# Altium footprint library con-molex.PCBLIB: 368 footprints (part 10 of 26)
Each footprint in its own frame and in the unit in brackets; x right, y up, seen from the top. Pads: shape width x height; smd on the part's side, far side on the other; paste and mask are expansions set on the pad; w line width, h text height; cw(c..) or ccw(c..) is an arc to the next point about the centre after c.
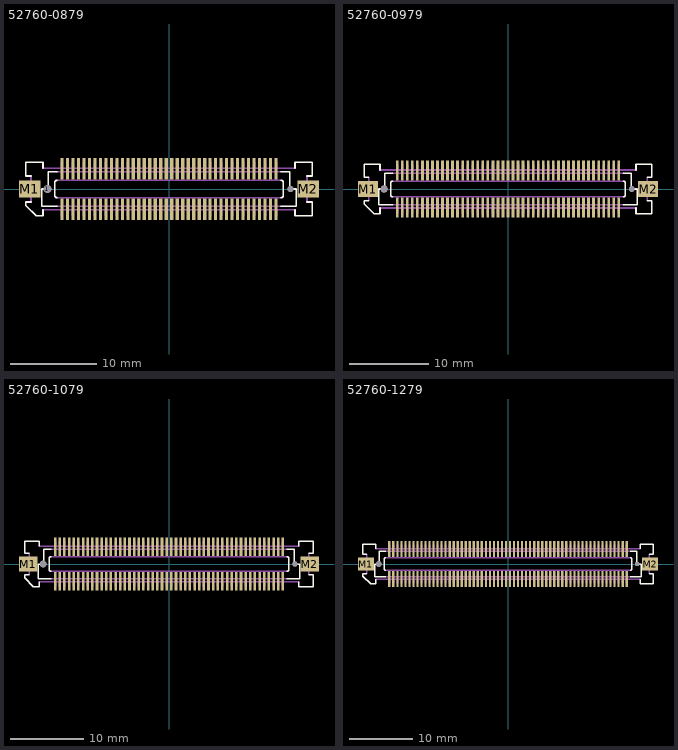
[diagram p9: the footprints below, top view; thin cyan lines are the x and y axes]

## 52760-0879 [mm]
pads (84):
  round 0.9 hole 0.9: 1(-14.035,0)
  rect 0.35x2.5 smd: 1(-12.383,-2.35) 2(-12.383,2.35) 3(-11.747,-2.35) 4(-11.747,2.35) 5(-11.112,-2.35) 6(-11.112,2.35) 7(-10.477,-2.35) 8(-10.477,2.35) 9(-9.842,-2.35) 10(-9.842,2.35) 11(-9.207,-2.35) 12(-9.207,2.35) 13(-8.572,-2.35) 14(-8.572,2.35) 15(-7.938,-2.35) 16(-7.938,2.35) 17(-7.302,-2.35) 18(-7.302,2.35) 19(-6.667,-2.35) 20(-6.667,2.35) 21(-6.032,-2.35) 22(-6.032,2.35) 23(-5.397,-2.35) 24(-5.397,2.35) 25(-4.763,-2.35) 26(-4.763,2.35) 27(-4.127,-2.35) 28(-4.127,2.35) 29(-3.492,-2.35) 30(-3.492,2.35) 31(-2.857,-2.35) 32(-2.857,2.35) 33(-2.222,-2.35) 34(-2.222,2.35) 35(-1.587,-2.35) 36(-1.587,2.35) 37(-0.953,-2.35) 38(-0.953,2.35) 39(-0.318,-2.35) 40(-0.318,2.35) 41(0.318,-2.35) 42(0.318,2.35) 43(0.953,-2.35) 44(0.953,2.35) 45(1.587,-2.35) 46(1.587,2.35) 47(2.222,-2.35) 48(2.222,2.35) 49(2.857,-2.35) 50(2.857,2.35) 51(3.492,-2.35) 52(3.492,2.35) 53(4.127,-2.35) 54(4.127,2.35) 55(4.763,-2.35) 56(4.763,2.35) 57(5.397,-2.35) 58(5.397,2.35) 59(6.032,-2.35) 60(6.032,2.35) 61(6.667,-2.35) 62(6.667,2.35) 63(7.302,-2.35) 64(7.302,2.35) 65(7.938,-2.35) 66(7.938,2.35) 67(8.572,-2.35) 68(8.572,2.35) 69(9.207,-2.35) 70(9.207,2.35) 71(9.842,-2.35) 72(9.842,2.35) 73(10.477,-2.35) 74(10.477,2.35) 75(11.112,-2.35) 76(11.112,2.35) 77(11.747,-2.35) 78(11.747,2.35) 79(12.383,-2.35) 80(12.383,2.35)
  round 0.7 hole 0.7: 1(14.035,0)
  rect 2.5x2 smd: M1(-16.075,0) M2(16.075,0)
Top Overlay:
  lines w0.203: -15.95,-1.5 -16.55,-1.5 -16.55,-1.9 -15.35,-3.1 -14.55,-3.1 -14.55,-2.4 ; -15.95,1.5 -16.55,1.5 -16.55,3.1 -14.55,3.1 -14.55,2.4 ; -12.95,-2 -14.7,-2 -14.7,0 -13.95,0 -13.95,2 -12.95,2 ; -12.95,-1 cw(c-12.95,-0.75) -13.2,-0.75 -13.2,0.75 cw(c-12.95,0.75) -12.95,1 ; 12.95,-2 14.7,-2 14.7,0 13.95,0 13.95,2 12.95,2 ; 12.95,-1 ccw(c12.95,-0.75) 13.2,-0.75 13.2,0.75 ccw(c12.95,0.75) 12.95,1 ; 14.55,-2.4 14.55,-3.1 16.55,-3.1 16.55,-1.5 15.95,-1.5 ; 14.55,2.4 14.55,3.1 16.55,3.1 16.55,1.5 15.95,1.5
Top Solder:
  rectangle: -12.582,-3.625 -12.183,-1.075
  region: -12.183,3.625 -12.582,3.625 -12.582,1.075 -12.183,1.075
  rectangle: -11.947,-3.625 -11.548,-1.075
  region: -11.548,3.625 -11.947,3.625 -11.947,1.075 -11.548,1.075
  rectangle: -11.312,-3.625 -10.913,-1.075
  region: -10.913,3.625 -11.312,3.625 -11.312,1.075 -10.913,1.075
  rectangle: -10.677,-3.625 -10.278,-1.075
  region: -10.278,3.625 -10.677,3.625 -10.677,1.075 -10.278,1.075
  rectangle: -10.042,-3.625 -9.643,-1.075
  region: -9.643,3.625 -10.042,3.625 -10.042,1.075 -9.643,1.075
  rectangle: -9.407,-3.625 -9.008,-1.075
  region: -9.008,3.625 -9.407,3.625 -9.407,1.075 -9.008,1.075
  rectangle: -8.772,-3.625 -8.373,-1.075
  region: -8.373,3.625 -8.772,3.625 -8.772,1.075 -8.373,1.075
  rectangle: -8.137,-3.625 -7.738,-1.075
  region: -7.738,3.625 -8.137,3.625 -8.137,1.075 -7.738,1.075
  rectangle: -7.502,-3.625 -7.103,-1.075
  region: -7.103,3.625 -7.502,3.625 -7.502,1.075 -7.103,1.075
  rectangle: -6.867,-3.625 -6.468,-1.075
  region: -6.468,3.625 -6.867,3.625 -6.867,1.075 -6.468,1.075
  rectangle: -6.232,-3.625 -5.833,-1.075
  region: -5.833,3.625 -6.232,3.625 -6.232,1.075 -5.833,1.075
  rectangle: -5.597,-3.625 -5.198,-1.075
  region: -5.198,3.625 -5.597,3.625 -5.597,1.075 -5.198,1.075
  rectangle: -4.962,-3.625 -4.563,-1.075
  region: -4.563,3.625 -4.962,3.625 -4.962,1.075 -4.563,1.075
  rectangle: -4.327,-3.625 -3.928,-1.075
  region: -3.928,3.625 -4.327,3.625 -4.327,1.075 -3.928,1.075
  rectangle: -3.692,-3.625 -3.293,-1.075
  region: -3.293,3.625 -3.692,3.625 -3.692,1.075 -3.293,1.075
  rectangle: -3.057,-3.625 -2.658,-1.075
  region: -2.658,3.625 -3.057,3.625 -3.057,1.075 -2.658,1.075
  rectangle: -2.422,-3.625 -2.023,-1.075
  region: -2.023,3.625 -2.422,3.625 -2.422,1.075 -2.023,1.075
  rectangle: -1.787,-3.625 -1.388,-1.075
  region: -1.388,3.625 -1.787,3.625 -1.787,1.075 -1.388,1.075
  rectangle: -1.152,-3.625 -0.753,-1.075
  region: -0.753,3.625 -1.152,3.625 -1.152,1.075 -0.753,1.075
  rectangle: -0.517,-3.625 -0.118,-1.075
  region: -0.118,3.625 -0.517,3.625 -0.517,1.075 -0.118,1.075
  rectangle: 0.118,-3.625 0.517,-1.075
  region: 0.517,3.625 0.118,3.625 0.118,1.075 0.517,1.075
  rectangle: 0.753,-3.625 1.152,-1.075
  region: 1.152,3.625 0.753,3.625 0.753,1.075 1.152,1.075
  rectangle: 1.388,-3.625 1.787,-1.075
  region: 1.787,3.625 1.388,3.625 1.388,1.075 1.787,1.075
  rectangle: 2.023,-3.625 2.422,-1.075
  region: 2.422,3.625 2.023,3.625 2.023,1.075 2.422,1.075
  rectangle: 2.658,-3.625 3.057,-1.075
  region: 3.057,3.625 2.658,3.625 2.658,1.075 3.057,1.075
  rectangle: 3.293,-3.625 3.692,-1.075
  region: 3.692,3.625 3.293,3.625 3.293,1.075 3.692,1.075
  rectangle: 3.928,-3.625 4.327,-1.075
  region: 4.327,3.625 3.928,3.625 3.928,1.075 4.327,1.075
  rectangle: 4.563,-3.625 4.962,-1.075
  region: 4.962,3.625 4.563,3.625 4.563,1.075 4.962,1.075
  rectangle: 5.198,-3.625 5.597,-1.075
  region: 5.597,3.625 5.198,3.625 5.198,1.075 5.597,1.075
  rectangle: 5.833,-3.625 6.232,-1.075
  region: 6.232,3.625 5.833,3.625 5.833,1.075 6.232,1.075
  rectangle: 6.468,-3.625 6.867,-1.075
  region: 6.867,3.625 6.468,3.625 6.468,1.075 6.867,1.075
  rectangle: 7.103,-3.625 7.502,-1.075
  region: 7.502,3.625 7.103,3.625 7.103,1.075 7.502,1.075
  rectangle: 7.738,-3.625 8.137,-1.075
  region: 8.137,3.625 7.738,3.625 7.738,1.075 8.137,1.075
  rectangle: 8.373,-3.625 8.772,-1.075
  region: 8.772,3.625 8.373,3.625 8.373,1.075 8.772,1.075
  rectangle: 9.008,-3.625 9.407,-1.075
  region: 9.407,3.625 9.008,3.625 9.008,1.075 9.407,1.075
  rectangle: 9.643,-3.625 10.042,-1.075
  region: 10.042,3.625 9.643,3.625 9.643,1.075 10.042,1.075
  rectangle: 10.278,-3.625 10.677,-1.075
  region: 10.677,3.625 10.278,3.625 10.278,1.075 10.677,1.075
  rectangle: 10.913,-3.625 11.312,-1.075
  region: 11.312,3.625 10.913,3.625 10.913,1.075 11.312,1.075
  rectangle: 11.548,-3.625 11.947,-1.075
  region: 11.947,3.625 11.548,3.625 11.548,1.075 11.947,1.075
  rectangle: 12.183,-3.625 12.582,-1.075
  region: 12.582,3.625 12.183,3.625 12.183,1.075 12.582,1.075
Mechanical 16:
  rectangle: -12.533,-3.1 -12.232,-2.375
  region: -12.232,3.1 -12.533,3.1 -12.533,2.375 -12.232,2.375
  rectangle: -11.898,-3.1 -11.597,-2.375
  region: -11.597,3.1 -11.898,3.1 -11.898,2.375 -11.597,2.375
  rectangle: -11.263,-3.1 -10.962,-2.375
  region: -10.962,3.1 -11.263,3.1 -11.263,2.375 -10.962,2.375
  rectangle: -10.628,-3.1 -10.327,-2.375
  region: -10.327,3.1 -10.628,3.1 -10.628,2.375 -10.327,2.375
  rectangle: -9.993,-3.1 -9.692,-2.375
  region: -9.692,3.1 -9.993,3.1 -9.993,2.375 -9.692,2.375
  rectangle: -9.358,-3.1 -9.057,-2.375
  region: -9.057,3.1 -9.358,3.1 -9.358,2.375 -9.057,2.375
  rectangle: -8.723,-3.1 -8.422,-2.375
  region: -8.422,3.1 -8.723,3.1 -8.723,2.375 -8.422,2.375
  rectangle: -8.088,-3.1 -7.787,-2.375
  region: -7.787,3.1 -8.088,3.1 -8.088,2.375 -7.787,2.375
  rectangle: -7.453,-3.1 -7.152,-2.375
  region: -7.152,3.1 -7.453,3.1 -7.453,2.375 -7.152,2.375
  rectangle: -6.818,-3.1 -6.517,-2.375
  region: -6.517,3.1 -6.818,3.1 -6.818,2.375 -6.517,2.375
  rectangle: -6.183,-3.1 -5.882,-2.375
  region: -5.882,3.1 -6.183,3.1 -6.183,2.375 -5.882,2.375
  rectangle: -5.548,-3.1 -5.247,-2.375
  region: -5.247,3.1 -5.548,3.1 -5.548,2.375 -5.247,2.375
  rectangle: -4.913,-3.1 -4.612,-2.375
  region: -4.612,3.1 -4.913,3.1 -4.913,2.375 -4.612,2.375
  rectangle: -4.278,-3.1 -3.977,-2.375
  region: -3.977,3.1 -4.278,3.1 -4.278,2.375 -3.977,2.375
  rectangle: -3.643,-3.1 -3.342,-2.375
  region: -3.342,3.1 -3.643,3.1 -3.643,2.375 -3.342,2.375
  rectangle: -3.008,-3.1 -2.707,-2.375
  region: -2.707,3.1 -3.008,3.1 -3.008,2.375 -2.707,2.375
  rectangle: -2.373,-3.1 -2.072,-2.375
  region: -2.072,3.1 -2.373,3.1 -2.373,2.375 -2.072,2.375
  rectangle: -1.738,-3.1 -1.437,-2.375
  region: -1.437,3.1 -1.738,3.1 -1.738,2.375 -1.437,2.375
  rectangle: -1.103,-3.1 -0.802,-2.375
  region: -0.802,3.1 -1.103,3.1 -1.103,2.375 -0.802,2.375
  rectangle: -0.468,-3.1 -0.167,-2.375
  region: -0.167,3.1 -0.468,3.1 -0.468,2.375 -0.167,2.375
  rectangle: 0.167,-3.1 0.468,-2.375
  region: 0.468,3.1 0.167,3.1 0.167,2.375 0.468,2.375
  rectangle: 0.802,-3.1 1.103,-2.375
  region: 1.103,3.1 0.802,3.1 0.802,2.375 1.103,2.375
  rectangle: 1.437,-3.1 1.738,-2.375
  region: 1.738,3.1 1.437,3.1 1.437,2.375 1.738,2.375
  rectangle: 2.072,-3.1 2.373,-2.375
  region: 2.373,3.1 2.072,3.1 2.072,2.375 2.373,2.375
  rectangle: 2.707,-3.1 3.008,-2.375
  region: 3.008,3.1 2.707,3.1 2.707,2.375 3.008,2.375
  rectangle: 3.342,-3.1 3.643,-2.375
  region: 3.643,3.1 3.342,3.1 3.342,2.375 3.643,2.375
  rectangle: 3.977,-3.1 4.278,-2.375
  region: 4.278,3.1 3.977,3.1 3.977,2.375 4.278,2.375
  rectangle: 4.612,-3.1 4.913,-2.375
  region: 4.913,3.1 4.612,3.1 4.612,2.375 4.913,2.375
  rectangle: 5.247,-3.1 5.548,-2.375
  region: 5.548,3.1 5.247,3.1 5.247,2.375 5.548,2.375
  rectangle: 5.882,-3.1 6.183,-2.375
  region: 6.183,3.1 5.882,3.1 5.882,2.375 6.183,2.375
  rectangle: 6.517,-3.1 6.818,-2.375
  region: 6.818,3.1 6.517,3.1 6.517,2.375 6.818,2.375
  rectangle: 7.152,-3.1 7.453,-2.375
  region: 7.453,3.1 7.152,3.1 7.152,2.375 7.453,2.375
  rectangle: 7.787,-3.1 8.088,-2.375
  region: 8.088,3.1 7.787,3.1 7.787,2.375 8.088,2.375
  rectangle: 8.422,-3.1 8.723,-2.375
  region: 8.723,3.1 8.422,3.1 8.422,2.375 8.723,2.375
  rectangle: 9.057,-3.1 9.358,-2.375
  region: 9.358,3.1 9.057,3.1 9.057,2.375 9.358,2.375
  rectangle: 9.692,-3.1 9.993,-2.375
  region: 9.993,3.1 9.692,3.1 9.692,2.375 9.993,2.375
  rectangle: 10.327,-3.1 10.628,-2.375
  region: 10.628,3.1 10.327,3.1 10.327,2.375 10.628,2.375
  rectangle: 10.962,-3.1 11.263,-2.375
  region: 11.263,3.1 10.962,3.1 10.962,2.375 11.263,2.375
  rectangle: 11.597,-3.1 11.898,-2.375
  region: 11.898,3.1 11.597,3.1 11.597,2.375 11.898,2.375
  rectangle: 12.232,-3.1 12.533,-2.375
  region: 12.533,3.1 12.232,3.1 12.232,2.375 12.533,2.375
  lines w0.203: -15.95,-1.5 -15.95,1.5 ; -14.55,-2.4 14.55,-2.4 ; -14.55,2.4 14.55,2.4 ; -12.95,-2 12.95,-2 ; -12.95,-1 12.95,-1 ; -12.95,1 12.95,1 ; -12.95,2 12.95,2 ; 15.95,-1.5 15.95,1.5

## 52760-0979 [mm]
pads (94):
  round 0.9 hole 0.9: 1(-15.623,0)
  rect 0.35x2.5 smd: 1(-13.97,-2.35) 2(-13.97,2.35) 3(-13.335,-2.35) 4(-13.335,2.35) 5(-12.7,-2.35) 6(-12.7,2.35) 7(-12.065,-2.35) 8(-12.065,2.35) 9(-11.43,-2.35) 10(-11.43,2.35) 11(-10.795,-2.35) 12(-10.795,2.35) 13(-10.16,-2.35) 14(-10.16,2.35) 15(-9.525,-2.35) 16(-9.525,2.35) 17(-8.89,-2.35) 18(-8.89,2.35) 19(-8.255,-2.35) 20(-8.255,2.35) 21(-7.62,-2.35) 22(-7.62,2.35) 23(-6.985,-2.35) 24(-6.985,2.35) 25(-6.35,-2.35) 26(-6.35,2.35) 27(-5.715,-2.35) 28(-5.715,2.35) 29(-5.08,-2.35) 30(-5.08,2.35) 31(-4.445,-2.35) 32(-4.445,2.35) 33(-3.81,-2.35) 34(-3.81,2.35) 35(-3.175,-2.35) 36(-3.175,2.35) 37(-2.54,-2.35) 38(-2.54,2.35) 39(-1.905,-2.35) 40(-1.905,2.35) 41(-1.27,-2.35) 42(-1.27,2.35) 43(-0.635,-2.35) 44(-0.635,2.35) 45(0,-2.35) 46(0,2.35) 47(0.635,-2.35) 48(0.635,2.35) 49(1.27,-2.35) 50(1.27,2.35) 51(1.905,-2.35) 52(1.905,2.35) 53(2.54,-2.35) 54(2.54,2.35) 55(3.175,-2.35) 56(3.175,2.35) 57(3.81,-2.35) 58(3.81,2.35) 59(4.445,-2.35) 60(4.445,2.35) 61(5.08,-2.35) 62(5.08,2.35) 63(5.715,-2.35) 64(5.715,2.35) 65(6.35,-2.35) 66(6.35,2.35) 67(6.985,-2.35) 68(6.985,2.35) 69(7.62,-2.35) 70(7.62,2.35) 71(8.255,-2.35) 72(8.255,2.35) 73(8.89,-2.35) 74(8.89,2.35) 75(9.525,-2.35) 76(9.525,2.35) 77(10.16,-2.35) 78(10.16,2.35) 79(10.795,-2.35) 80(10.795,2.35) 81(11.43,-2.35) 82(11.43,2.35) 83(12.065,-2.35) 84(12.065,2.35) 85(12.7,-2.35) 86(12.7,2.35) 87(13.335,-2.35) 88(13.335,2.35) 89(13.97,-2.35) 90(13.97,2.35)
  round 0.7 hole 0.7: 1(15.623,0)
  rect 2.5x2 smd: M1(-17.662,0) M2(17.662,0)
Top Overlay:
  lines w0.203: -17.537,-1.5 -18.137,-1.5 -18.137,-1.9 -16.937,-3.1 -16.137,-3.1 -16.137,-2.4 ; -17.537,1.5 -18.137,1.5 -18.137,3.1 -16.137,3.1 -16.137,2.4 ; -14.537,-2 -16.287,-2 -16.287,0 -15.537,0 -15.537,2 -14.537,2 ; -14.537,-1 cw(c-14.538,-0.75) -14.788,-0.75 -14.788,0.75 cw(c-14.538,0.75) -14.537,1 ; 14.537,-2 16.287,-2 16.287,0 15.537,0 15.537,2 14.537,2 ; 14.537,-1 ccw(c14.538,-0.75) 14.788,-0.75 14.788,0.75 ccw(c14.538,0.75) 14.537,1 ; 16.137,-2.4 16.137,-3.1 18.137,-3.1 18.137,-1.5 17.537,-1.5 ; 16.137,2.4 16.137,3.1 18.137,3.1 18.137,1.5 17.537,1.5
Top Solder:
  rectangle: -14.17,-3.625 -13.77,-1.075
  region: -13.77,3.625 -14.17,3.625 -14.17,1.075 -13.77,1.075
  rectangle: -13.535,-3.625 -13.135,-1.075
  region: -13.135,3.625 -13.535,3.625 -13.535,1.075 -13.135,1.075
  rectangle: -12.9,-3.625 -12.5,-1.075
  region: -12.5,3.625 -12.9,3.625 -12.9,1.075 -12.5,1.075
  rectangle: -12.265,-3.625 -11.865,-1.075
  region: -11.865,3.625 -12.265,3.625 -12.265,1.075 -11.865,1.075
  rectangle: -11.63,-3.625 -11.23,-1.075
  region: -11.23,3.625 -11.63,3.625 -11.63,1.075 -11.23,1.075
  rectangle: -10.995,-3.625 -10.595,-1.075
  region: -10.595,3.625 -10.995,3.625 -10.995,1.075 -10.595,1.075
  rectangle: -10.36,-3.625 -9.96,-1.075
  region: -9.96,3.625 -10.36,3.625 -10.36,1.075 -9.96,1.075
  rectangle: -9.725,-3.625 -9.325,-1.075
  region: -9.325,3.625 -9.725,3.625 -9.725,1.075 -9.325,1.075
  rectangle: -9.09,-3.625 -8.69,-1.075
  region: -8.69,3.625 -9.09,3.625 -9.09,1.075 -8.69,1.075
  rectangle: -8.455,-3.625 -8.055,-1.075
  region: -8.055,3.625 -8.455,3.625 -8.455,1.075 -8.055,1.075
  rectangle: -7.82,-3.625 -7.42,-1.075
  region: -7.42,3.625 -7.82,3.625 -7.82,1.075 -7.42,1.075
  rectangle: -7.185,-3.625 -6.785,-1.075
  region: -6.785,3.625 -7.185,3.625 -7.185,1.075 -6.785,1.075
  rectangle: -6.55,-3.625 -6.15,-1.075
  region: -6.15,3.625 -6.55,3.625 -6.55,1.075 -6.15,1.075
  rectangle: -5.915,-3.625 -5.515,-1.075
  region: -5.515,3.625 -5.915,3.625 -5.915,1.075 -5.515,1.075
  rectangle: -5.28,-3.625 -4.88,-1.075
  region: -4.88,3.625 -5.28,3.625 -5.28,1.075 -4.88,1.075
  rectangle: -4.645,-3.625 -4.245,-1.075
  region: -4.245,3.625 -4.645,3.625 -4.645,1.075 -4.245,1.075
  rectangle: -4.01,-3.625 -3.61,-1.075
  region: -3.61,3.625 -4.01,3.625 -4.01,1.075 -3.61,1.075
  rectangle: -3.375,-3.625 -2.975,-1.075
  region: -2.975,3.625 -3.375,3.625 -3.375,1.075 -2.975,1.075
  rectangle: -2.74,-3.625 -2.34,-1.075
  region: -2.34,3.625 -2.74,3.625 -2.74,1.075 -2.34,1.075
  rectangle: -2.105,-3.625 -1.705,-1.075
  region: -1.705,3.625 -2.105,3.625 -2.105,1.075 -1.705,1.075
  rectangle: -1.47,-3.625 -1.07,-1.075
  region: -1.07,3.625 -1.47,3.625 -1.47,1.075 -1.07,1.075
  rectangle: -0.835,-3.625 -0.435,-1.075
  region: -0.435,3.625 -0.835,3.625 -0.835,1.075 -0.435,1.075
  rectangle: -0.2,-3.625 0.2,-1.075
  region: 0.2,3.625 -0.2,3.625 -0.2,1.075 0.2,1.075
  rectangle: 0.435,-3.625 0.835,-1.075
  region: 0.835,3.625 0.435,3.625 0.435,1.075 0.835,1.075
  rectangle: 1.07,-3.625 1.47,-1.075
  region: 1.47,3.625 1.07,3.625 1.07,1.075 1.47,1.075
  rectangle: 1.705,-3.625 2.105,-1.075
  region: 2.105,3.625 1.705,3.625 1.705,1.075 2.105,1.075
  rectangle: 2.34,-3.625 2.74,-1.075
  region: 2.74,3.625 2.34,3.625 2.34,1.075 2.74,1.075
  rectangle: 2.975,-3.625 3.375,-1.075
  region: 3.375,3.625 2.975,3.625 2.975,1.075 3.375,1.075
  rectangle: 3.61,-3.625 4.01,-1.075
  region: 4.01,3.625 3.61,3.625 3.61,1.075 4.01,1.075
  rectangle: 4.245,-3.625 4.645,-1.075
  region: 4.645,3.625 4.245,3.625 4.245,1.075 4.645,1.075
  rectangle: 4.88,-3.625 5.28,-1.075
  region: 5.28,3.625 4.88,3.625 4.88,1.075 5.28,1.075
  rectangle: 5.515,-3.625 5.915,-1.075
  region: 5.915,3.625 5.515,3.625 5.515,1.075 5.915,1.075
  rectangle: 6.15,-3.625 6.55,-1.075
  region: 6.55,3.625 6.15,3.625 6.15,1.075 6.55,1.075
  rectangle: 6.785,-3.625 7.185,-1.075
  region: 7.185,3.625 6.785,3.625 6.785,1.075 7.185,1.075
  rectangle: 7.42,-3.625 7.82,-1.075
  region: 7.82,3.625 7.42,3.625 7.42,1.075 7.82,1.075
  rectangle: 8.055,-3.625 8.455,-1.075
  region: 8.455,3.625 8.055,3.625 8.055,1.075 8.455,1.075
  rectangle: 8.69,-3.625 9.09,-1.075
  region: 9.09,3.625 8.69,3.625 8.69,1.075 9.09,1.075
  rectangle: 9.325,-3.625 9.725,-1.075
  region: 9.725,3.625 9.325,3.625 9.325,1.075 9.725,1.075
  rectangle: 9.96,-3.625 10.36,-1.075
  region: 10.36,3.625 9.96,3.625 9.96,1.075 10.36,1.075
  rectangle: 10.595,-3.625 10.995,-1.075
  region: 10.995,3.625 10.595,3.625 10.595,1.075 10.995,1.075
  rectangle: 11.23,-3.625 11.63,-1.075
  region: 11.63,3.625 11.23,3.625 11.23,1.075 11.63,1.075
  rectangle: 11.865,-3.625 12.265,-1.075
  region: 12.265,3.625 11.865,3.625 11.865,1.075 12.265,1.075
  rectangle: 12.5,-3.625 12.9,-1.075
  region: 12.9,3.625 12.5,3.625 12.5,1.075 12.9,1.075
  rectangle: 13.135,-3.625 13.535,-1.075
  region: 13.535,3.625 13.135,3.625 13.135,1.075 13.535,1.075
  rectangle: 13.77,-3.625 14.17,-1.075
  region: 14.17,3.625 13.77,3.625 13.77,1.075 14.17,1.075
Mechanical 16:
  rectangle: -14.12,-3.1 -13.82,-2.375
  region: -13.82,3.1 -14.12,3.1 -14.12,2.375 -13.82,2.375
  rectangle: -13.485,-3.1 -13.185,-2.375
  region: -13.185,3.1 -13.485,3.1 -13.485,2.375 -13.185,2.375
  rectangle: -12.85,-3.1 -12.55,-2.375
  region: -12.55,3.1 -12.85,3.1 -12.85,2.375 -12.55,2.375
  rectangle: -12.215,-3.1 -11.915,-2.375
  region: -11.915,3.1 -12.215,3.1 -12.215,2.375 -11.915,2.375
  rectangle: -11.58,-3.1 -11.28,-2.375
  region: -11.28,3.1 -11.58,3.1 -11.58,2.375 -11.28,2.375
  rectangle: -10.945,-3.1 -10.645,-2.375
  region: -10.645,3.1 -10.945,3.1 -10.945,2.375 -10.645,2.375
  rectangle: -10.31,-3.1 -10.01,-2.375
  region: -10.01,3.1 -10.31,3.1 -10.31,2.375 -10.01,2.375
  rectangle: -9.675,-3.1 -9.375,-2.375
  region: -9.375,3.1 -9.675,3.1 -9.675,2.375 -9.375,2.375
  rectangle: -9.04,-3.1 -8.74,-2.375
  region: -8.74,3.1 -9.04,3.1 -9.04,2.375 -8.74,2.375
  rectangle: -8.405,-3.1 -8.105,-2.375
  region: -8.105,3.1 -8.405,3.1 -8.405,2.375 -8.105,2.375
  rectangle: -7.77,-3.1 -7.47,-2.375
  region: -7.47,3.1 -7.77,3.1 -7.77,2.375 -7.47,2.375
  rectangle: -7.135,-3.1 -6.835,-2.375
  region: -6.835,3.1 -7.135,3.1 -7.135,2.375 -6.835,2.375
  rectangle: -6.5,-3.1 -6.2,-2.375
  region: -6.2,3.1 -6.5,3.1 -6.5,2.375 -6.2,2.375
  rectangle: -5.865,-3.1 -5.565,-2.375
  region: -5.565,3.1 -5.865,3.1 -5.865,2.375 -5.565,2.375
  rectangle: -5.23,-3.1 -4.93,-2.375
  region: -4.93,3.1 -5.23,3.1 -5.23,2.375 -4.93,2.375
  rectangle: -4.595,-3.1 -4.295,-2.375
  region: -4.295,3.1 -4.595,3.1 -4.595,2.375 -4.295,2.375
  rectangle: -3.96,-3.1 -3.66,-2.375
  region: -3.66,3.1 -3.96,3.1 -3.96,2.375 -3.66,2.375
  rectangle: -3.325,-3.1 -3.025,-2.375
  region: -3.025,3.1 -3.325,3.1 -3.325,2.375 -3.025,2.375
  rectangle: -2.69,-3.1 -2.39,-2.375
  region: -2.39,3.1 -2.69,3.1 -2.69,2.375 -2.39,2.375
  rectangle: -2.055,-3.1 -1.755,-2.375
  region: -1.755,3.1 -2.055,3.1 -2.055,2.375 -1.755,2.375
  rectangle: -1.42,-3.1 -1.12,-2.375
  region: -1.12,3.1 -1.42,3.1 -1.42,2.375 -1.12,2.375
  rectangle: -0.785,-3.1 -0.485,-2.375
  region: -0.485,3.1 -0.785,3.1 -0.785,2.375 -0.485,2.375
  rectangle: -0.15,-3.1 0.15,-2.375
  region: 0.15,3.1 -0.15,3.1 -0.15,2.375 0.15,2.375
  rectangle: 0.485,-3.1 0.785,-2.375
  region: 0.785,3.1 0.485,3.1 0.485,2.375 0.785,2.375
  rectangle: 1.12,-3.1 1.42,-2.375
  region: 1.42,3.1 1.12,3.1 1.12,2.375 1.42,2.375
  rectangle: 1.755,-3.1 2.055,-2.375
  region: 2.055,3.1 1.755,3.1 1.755,2.375 2.055,2.375
  rectangle: 2.39,-3.1 2.69,-2.375
  region: 2.69,3.1 2.39,3.1 2.39,2.375 2.69,2.375
  rectangle: 3.025,-3.1 3.325,-2.375
  region: 3.325,3.1 3.025,3.1 3.025,2.375 3.325,2.375
  rectangle: 3.66,-3.1 3.96,-2.375
  region: 3.96,3.1 3.66,3.1 3.66,2.375 3.96,2.375
  rectangle: 4.295,-3.1 4.595,-2.375
  region: 4.595,3.1 4.295,3.1 4.295,2.375 4.595,2.375
  rectangle: 4.93,-3.1 5.23,-2.375
  region: 5.23,3.1 4.93,3.1 4.93,2.375 5.23,2.375
  rectangle: 5.565,-3.1 5.865,-2.375
  region: 5.865,3.1 5.565,3.1 5.565,2.375 5.865,2.375
  rectangle: 6.2,-3.1 6.5,-2.375
  region: 6.5,3.1 6.2,3.1 6.2,2.375 6.5,2.375
  rectangle: 6.835,-3.1 7.135,-2.375
  region: 7.135,3.1 6.835,3.1 6.835,2.375 7.135,2.375
  rectangle: 7.47,-3.1 7.77,-2.375
  region: 7.77,3.1 7.47,3.1 7.47,2.375 7.77,2.375
  rectangle: 8.105,-3.1 8.405,-2.375
  region: 8.405,3.1 8.105,3.1 8.105,2.375 8.405,2.375
  rectangle: 8.74,-3.1 9.04,-2.375
  region: 9.04,3.1 8.74,3.1 8.74,2.375 9.04,2.375
  rectangle: 9.375,-3.1 9.675,-2.375
  region: 9.675,3.1 9.375,3.1 9.375,2.375 9.675,2.375
  rectangle: 10.01,-3.1 10.31,-2.375
  region: 10.31,3.1 10.01,3.1 10.01,2.375 10.31,2.375
  rectangle: 10.645,-3.1 10.945,-2.375
  region: 10.945,3.1 10.645,3.1 10.645,2.375 10.945,2.375
  rectangle: 11.28,-3.1 11.58,-2.375
  region: 11.58,3.1 11.28,3.1 11.28,2.375 11.58,2.375
  rectangle: 11.915,-3.1 12.215,-2.375
  region: 12.215,3.1 11.915,3.1 11.915,2.375 12.215,2.375
  rectangle: 12.55,-3.1 12.85,-2.375
  region: 12.85,3.1 12.55,3.1 12.55,2.375 12.85,2.375
  rectangle: 13.185,-3.1 13.485,-2.375
  region: 13.485,3.1 13.185,3.1 13.185,2.375 13.485,2.375
  rectangle: 13.82,-3.1 14.12,-2.375
  region: 14.12,3.1 13.82,3.1 13.82,2.375 14.12,2.375
  lines w0.203: -17.537,-1.5 -17.537,1.5 ; -16.137,-2.4 16.137,-2.4 ; -16.137,2.4 16.137,2.4 ; -14.537,-2 14.537,-2 ; -14.537,-1 14.537,-1 ; -14.537,1 14.537,1 ; -14.537,2 14.537,2 ; 17.537,-1.5 17.537,1.5
